# Altium footprint library PCB_Module.PcbLib: 39 footprints (part 3 of 3)
Each footprint in its own frame and in the unit in brackets; x right, y up, seen from the top. Pads: shape width x height; smd on the part's side, far side on the other; paste and mask are expansions set on the pad; w line width, h text height; cw(c..) or ccw(c..) is an arc to the next point about the centre after c.
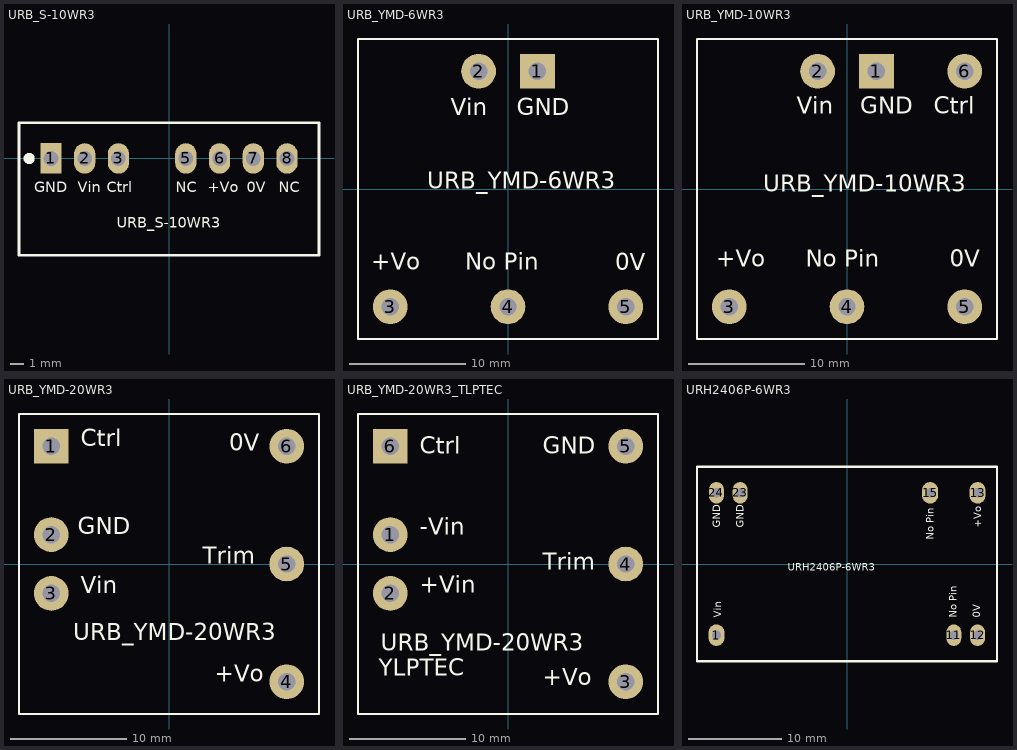
[diagram p2: the footprints below, top view; thin cyan lines are the x and y axes]

## URB_S-10WR3 [mm]
pads (7):
  rect 1.6x2.3 hole 1.1: 1(-8.89,0)
  oval 1.6x2.3 hole 1.1: 2(-6.35,0) 3(-3.81,0) 5(1.27,0) 6(3.81,0) 7(6.35,0) 8(8.89,0)
Top Overlay:
  circle w0.6: c-10.531,0 r0.117
  lines w0.203: -11.3,-7.3 11.3,-7.3 11.3,2.7 -11.3,2.7 -11.3,-7.3
  text "NC" at 8.255,-2.54 h0.8
  text "Ctrl" at -4.699,-2.54 h0.8
  text "URB_S-10WR3" at -3.937,-5.207 h0.8
  text "NC" at 0.508,-2.54 h0.8
  text "0V" at 5.842,-2.54 h0.8
  text "+Vo" at 2.921,-2.54 h0.8
  text "GND" at -10.16,-2.54 h0.8
  text "Vin" at -6.858,-2.54 h0.8
3D body "URB_S-10WR3.stp": height 12.1, standoff -4, extent -11,-6.909 11,2.591

## URB_YMD-6WR3 [mm]
pads (5):
  rect 3x3 hole 1.5: 1(2.54,10.16)
  round 3 hole 1.5: 2(-2.54,10.16) 3(-10.16,-10.16) 4(0,-10.16) 5(10.16,-10.16)
Top Overlay:
  lines w0.2: -12.95,-12.95 -12.95,12.95 12.95,12.95 12.95,-12.95 -12.95,-12.95
  text "0V" at 9.271,-7.523 h2.5
  text "URB_YMD-6WR3" at -6.985,-0.508 h2.5
  text "GND" at 0.762,5.842 h2.5
  text "Vin" at -4.953,5.842 h2.5
  text "+Vo" at -11.811,-7.493 h2.5
  text "No Pin" at -3.683,-7.493 h2.5
3D body "URB_YMD-6WR3.stp": height 12.34, standoff -3.51, extent -12.725,-12.6 12.725,12.8

## URB_YMD-10WR3 [mm]
pads (6):
  rect 3x3 hole 1.5: 1(2.54,10.16)
  round 3 hole 1.5: 2(-2.54,10.16) 3(-10.16,-10.16) 4(0,-10.16) 5(10.16,-10.16) 6(10.16,10.16)
Top Overlay:
  lines w0.2: -12.95,-12.95 12.95,-12.95 12.95,12.95 -12.95,12.95 -12.95,-12.95
  text "No Pin" at -3.556,-7.209 h2.5
  text "Ctrl" at 7.493,5.969 h2.5
  text "0V" at 8.89,-7.239 h2.5
  text "URB_YMD-10WR3" at -7.239,-0.762 h2.5
  text "GND" at 1.143,5.969 h2.5
  text "Vin" at -4.318,5.969 h2.5
  text "+Vo" at -11.303,-7.209 h2.5
3D body "URB_YMD-10WR3.stp": height 11.83, standoff -4.02, extent -12.75,-12.7 12.7,12.7

## URB_YMD-20WR3 [mm]
pads (6):
  rect 3x3 hole 1.5: 1(-10.16,10.16)
  round 3 hole 1.5: 2(-10.16,2.54) 3(-10.16,-2.54) 4(10.16,-10.16) 5(10.16,0) 6(10.16,10.16)
Top Overlay:
  lines w0.2: -12.95,-12.95 12.95,-12.95 12.95,12.95 -12.95,12.95 -12.95,-12.95
  text "Trim" at 2.921,-0.508 h2.5
  text "+Vo" at 3.937,-10.668 h2.5
  text "Vin" at -7.62,-3.048 h2.5
  text "GND" at -7.874,2.032 h2.5
  text "URB_YMD-20WR3" at -8.255,-7.112 h2.5
  text "Ctrl" at -7.62,9.652 h2.5
  text "0V" at 5.207,9.271 h2.5
3D body "URB_YMD-20WR3.stp": height 12.08, standoff -3.77, extent -12.6,-12.8 12.8,12.65

## URB_YMD-20WR3_TLPTEC [mm]
pads (6):
  round 3 hole 1.5: 1(-10.16,2.54) 2(-10.16,-2.54) 3(10.16,-10.16) 4(10.16,0) 5(10.16,10.16)
  rect 3x3 hole 1.5: 6(-10.16,10.16)
Top Overlay:
  lines w0.2: -12.95,-12.95 12.95,-12.95 12.95,12.95 -12.95,12.95 -12.95,-12.95
  text "Trim" at 3,-1 h2.5
  text "+Vo" at 3,-11 h2.5
  text "+Vin" at -7.62,-3 h2.5
  text "-Vin" at -7.62,2 h2.5
  text "URB_YMD-20WR3" at -11,-8 h2.5
  text "Ctrl" at -7.62,9 h2.5
  text "GND" at 3,9 h2.5
  text "YLPTEC" at -11.16,-10.16 h2.5
3D body "URB_YMD-20WR3.stp": height 12.08, standoff -3.77, extent -12.6,-12.8 12.8,12.65

## URH2406P-6WR3 [mm]
pads (7):
  oval 1.7x2.3 hole 1 mask+0.08: 1(-13.97,-7.62) 13(13.97,7.62) 15(8.89,7.62)
  oval 1.6x2.3 hole 1 mask+0.08: 11(11.43,-7.62) 12(13.97,-7.62) 23(-11.43,7.62) 24(-13.97,7.62)
Top Overlay:
  lines w0.254: -16.05,-10.4 -16.05,10.4 16.05,10.4 16.05,-10.4 -16.05,-10.4
  text "GND" at -13.572,3.872 h0.76
  text "GND" at -11.032,3.872 h0.76
  text "No Pin" at 9.288,2.588 h0.76
  text "Vin" at -13.482,-5.738 h0.76
  text "No Pin" at 11.724,-5.743 h0.76
  text "0V" at 14.264,-5.743 h0.76
  text "+Vo" at 14.368,3.872 h0.76
  text "URH2406P-6WR3" at -6.344,-0.722 h0.76
3D body "URH_P-6WR3.stp": height 10.22, standoff -3.98, extent -15.801,-10.2 15.801,10.102

## z_other [mil]
3D body "User Library-ESP-03.STEP": height 91.34, standoff -44.09, extent -910,-285.55 -425.75,395.55
3D body "User Library-ESP-12E.STEP": height 104.33, standoff -1.38, extent -300.16,-252.64 330.15,692.44
3D body "User Library-WiFi ESP8266.STEP": height 141.73, standoff -1.97, extent 415.08,-302.32 1045,532.32